# Altium footprint library PcbLib1.PcbLib: 42 footprints (part 3 of 3)
Each footprint in its own frame and in the unit in brackets; x right, y up, seen from the top. Pads: shape width x height; smd on the part's side, far side on the other; paste and mask are expansions set on the pad; w line width, h text height; cw(c..) or ccw(c..) is an arc to the next point about the centre after c.
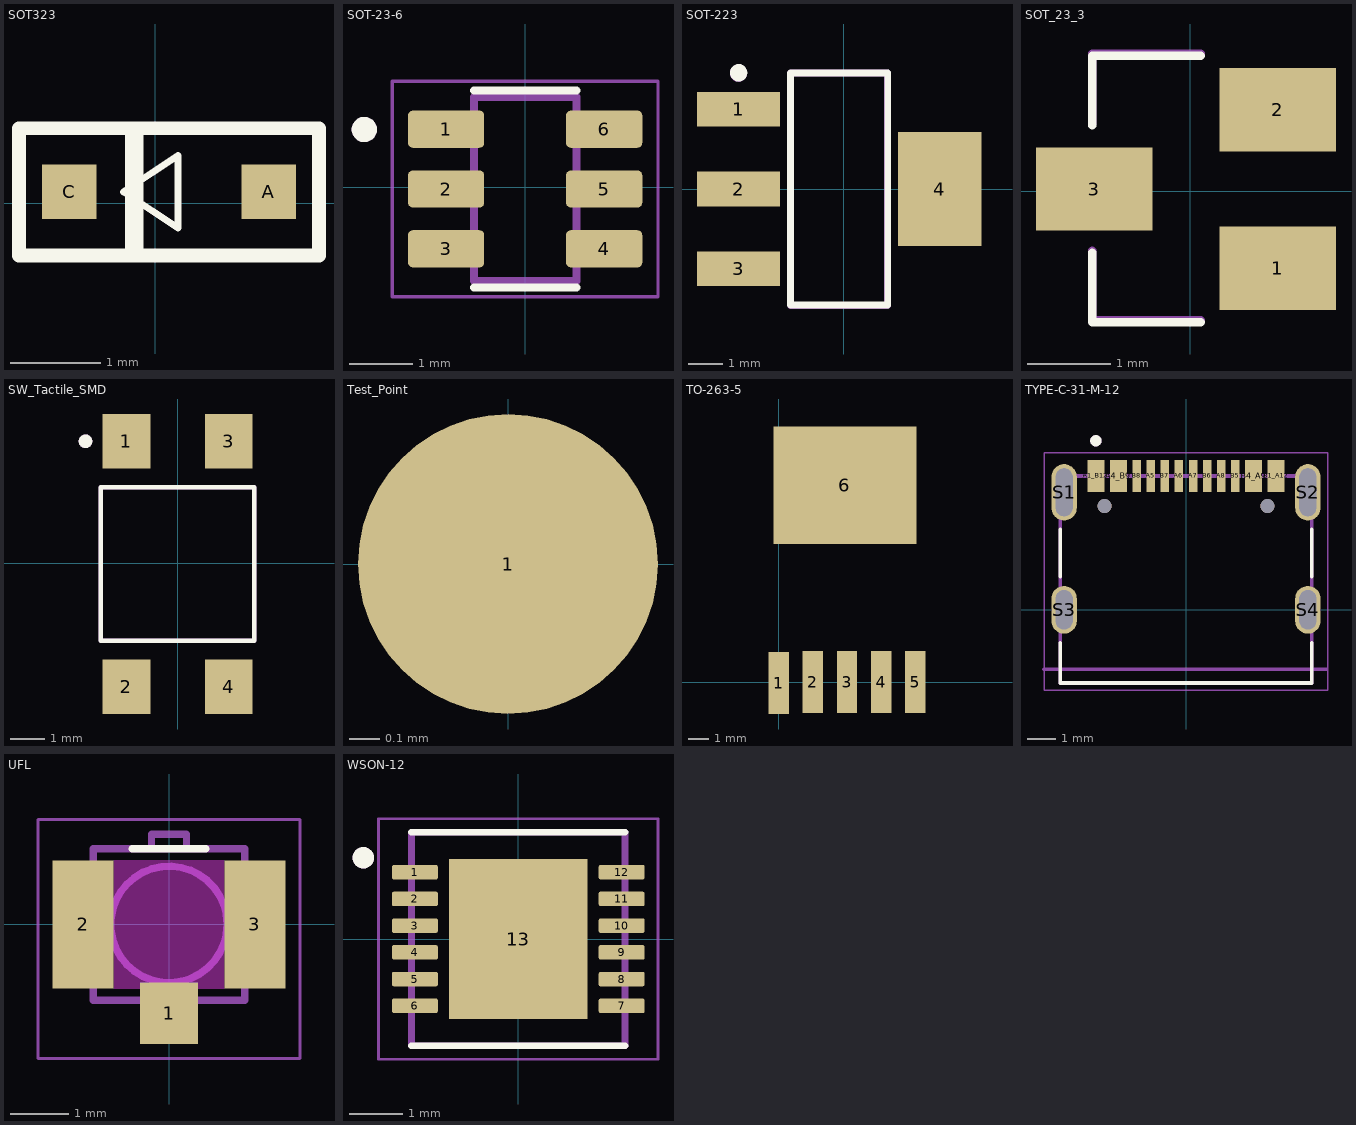
[diagram p2: the footprints below, top view; thin cyan lines are the x and y axes]

## SOT323 [mm]
pads (2):
  rect 0.6x0.6 smd: A(1.252,0.124) C(-0.948,0.124)
Top Overlay:
  region: -0.129,-0.514 -0.329,-0.514 -0.329,0.886 -0.129,0.886
  lines w0.076: -0.348,0.124 0.252,-0.276 0.252,0.524 -0.348,0.124
  lines w0.152: -1.499,-0.576 -1.499,0.824 1.803,0.824 1.803,-0.576 -1.499,-0.576
3D body "step_temp.STEP": height 1.15, standoff 0, extent -1.185,-0.526 1.49,0.774

## SOT-23-6 [mm]
pads (6):
  rrect25% 1.21x0.59 smd: 1(-1.255,0.925) 2(-1.255,-0.025) 3(-1.255,-0.975) 4(1.255,-0.975) 5(1.255,-0.025) 6(1.255,0.925)
Top Overlay:
  circle w0.2: c-2.555,0.92 r0.1
  lines w0.127: -0.813,-1.59 0.813,-1.59 ; -0.813,1.54 0.813,1.54
Mechanical 13:
  circle w0.2: c-2.555,0.92 r0.1
  lines w0.127: -0.813,-1.488 0.813,-1.488 0.813,1.437 -0.813,1.437 -0.813,-1.488
Mechanical 15:
  lines w0.05: -2.11,-1.738 -2.11,1.687 2.11,1.687 2.11,-1.738 -2.11,-1.738
3D body "step_temp.STEP": height 1.4, standoff -0.05, extent -1.4,-1.488 1.4,1.437

## SOT-223 [mm]
pads (4):
  rect 2.4x1 smd: 1(-3.026,2.3) 2(-3.026,0) 3(-3.026,-2.3)
  rect 2.4x3.3 smd: 4(2.774,0)
Top Overlay:
  circle w0.25: c-3.026,3.35 r0.125
  lines w0.2: -1.526,-3.35 -1.526,3.35 1.274,3.35 1.274,-3.35 -1.526,-3.35
Mechanical 1:
  circle w0.25: c-3.032,3.342 r0.125
  lines w0.2: -1.532,-3.358 -1.532,3.342 1.268,3.342 1.268,-3.358 -1.532,-3.358
  text ".Designator" at -0.15,-0.125 h1.8
3D body "User Library-SOT223-3.step": height 1.7, standoff 0, extent -3.88,-3.25 3.12,3.25

## SOT_23_3 [mm]
pads (3):
  rect 1.4x1 smd paste+0 mask+0.076: 1(1.05,-0.925) 2(1.05,0.975) 3(-1.15,0.025)
Top Overlay:
  lines w0.1: -1.175,-0.737 -1.175,-1.575 0.125,-1.575 ; -1.175,0.788 -1.175,1.625 0.125,1.625
Mechanical 1:
  lines w0.1: -1.175,-0.712 -1.175,-1.55 0.125,-1.55 ; -1.175,0.813 -1.175,1.65 0.125,1.65
  text ".Designator" at -0.125,-0.075 h1.8
3D body "SOT23_TO-236AA.STEP": height 1.3, standoff 0, extent -1.55,-1.475 1.45,1.525

## SW_Tactile_SMD [mm]
pads (4):
  rect 1.4x1.6 smd: 1(-1.5,3.575) 2(-1.5,-3.625) 3(1.5,3.575) 4(1.5,-3.625)
Top Overlay:
  circle w0.2: c-2.7,3.575 r0.1
  lines w0.127: -2.25,-2.275 -2.25,2.225 2.25,2.225 2.25,-2.275 -2.25,-2.275
  text ".Designator" at -0.15,-0.05 h1.8
Mechanical 1:
  circle w0.2: c-2.7,3.575 r0.1
  lines w0.127: -2.25,-2.275 2.25,-2.275 2.25,2.225 -2.25,2.225 -2.25,-2.275
3D body "step_temp.STEP": height 3.8, standoff 0, extent -2.25,-3.775 2.25,3.725

## Test_Point [mm]
pads (1):
  round 1 smd: 1(0,0)

## TO-263-5 [mm]
pads (6):
  rect 1.02x3.08 smd: 1(0,-0.05) 2(1.7,0) 3(3.4,0) 4(5.1,0) 5(6.8,0)
  rect 7.1x5.85 smd: 6(3.3,9.8)
3D body "MIC29302AWU-TR.step": height 4.84, standoff -0.24, extent -1.68,-1.119 8.48,13.79

## TYPE-C-31-M-12 [mm]
pads (18):
  rect 0.6x1.14 smd mask+0.05: A1_B12(-3.2,4.75) A4_B9(-2.4,4.75) B1_A12(3.2,4.75) B4_A9(2.4,4.75)
  rect 0.3x1.14 smd mask+0.05: A5(-1.25,4.75) A6(-0.25,4.75) A7(0.25,4.75) A8(1.25,4.75) B5(1.75,4.75) B6(0.75,4.75) B7(-0.75,4.75) B8(-1.75,4.75)
  oval 0.9x2 hole 0.6 slot 1.7 at 90 deg: S1(-4.325,4.17) S2(4.325,4.17)
  oval 0.9x1.7 hole 0.6 slot 1.4 at 90 deg: S3(-4.325,0) S4(4.325,0)
  round 0.5 hole 0.5 unplated: ""(-2.89,3.68) ""(2.89,3.68)
Top Overlay:
  circle w0.2: c-3.2,6 r0.1
  lines w0.127: -4.47,-1.17 -4.47,-2.6 4.47,-2.6 4.47,-1.17 ; -4.47,1.17 -4.47,2.85 ; 4.47,1.17 4.47,2.85
Mechanical 13:
  circle w0.2: c-3.2,6 r0.1
  lines w0.127: -5.05,-2.11 5,-2.11 ; -4.47,-2.6 4.47,-2.6 4.47,4.75 -4.47,4.75 -4.47,-2.6
Mechanical 15:
  lines w0.05: -5.025,-2.85 -5.025,5.57 5.025,5.57 5.025,-2.85 -5.025,-2.85
3D body "step_temp.STEP": height 3.31, standoff -0.99, extent -4.47,-2.6 4.47,5.305

## UFL [mm]
pads (3):
  rect 1x1.05 smd paste-0.1: 1(0,-1.525)
  rect 1.05x2.2 smd paste-2: 2(-1.475,0) 3(1.475,0)
Top Overlay:
  lines w0.127: -0.63,1.3 0.63,1.3
Top Paste:
  region: -1.05,-1 -1.95,-1 -1.95,1 -1.05,1
  region: 1.95,-1 1.05,-1 1.05,1 1.95,1
Keep-Out Layer:
  region: 0.95,-1.1 0.5,-1.1 0.5,-1 -0.5,-1 -0.5,-1.1 -0.95,-1.1 -0.95,1.1 0.95,1.1
Mechanical 13:
  circle w0.127: c0,0 r1
  lines w0.127: -0.3,1.3 -1.3,1.3 -1.3,-1.3 1.3,-1.3 1.3,1.3 0.3,1.3 ; -0.3,1.3 0.3,1.3 ; -0.3,1.3 -0.3,1.55 0.3,1.55 0.3,1.3
Mechanical 15:
  lines w0.05: -2.25,-2.3 2.25,-2.3 2.25,1.8 -2.25,1.8 -2.25,-2.3
3D body "U.FL-R-SMT-1(80)--3DModel-STEP-1.STEP": height 1.26, standoff 0.01, extent -1.475,-1.55 1.525,1.55

## WSON-12 [mm]
pads (13):
  rrect25% 0.86x0.27 smd: 1(-1.935,1.25) 2(-1.935,0.75) 3(-1.935,0.25) 4(-1.935,-0.25) 5(-1.935,-0.75) 6(-1.935,-1.25) 7(1.935,-1.25) 8(1.935,-0.75) 9(1.935,-0.25) 10(1.935,0.25) 11(1.935,0.75) 12(1.935,1.25)
  rect 2.6x3 smd paste-0.48: 13(0,0)
Top Overlay:
  circle w0.2: c-2.9,1.52 r0.1
  lines w0.127: -2,-2 2,-2 ; -2,2 2,2
Mechanical 13:
  circle w0.2: c-2.9,1.52 r0.1
  lines w0.127: -2,-2 2,-2 2,2 -2,2 -2,-2
Mechanical 15:
  lines w0.05: -2.615,-2.25 2.615,-2.25 2.615,2.25 -2.615,2.25 -2.615,-2.25
3D body "step_temp.STEP": height 1, standoff 0, extent -2,-2 2,2